# Altium integrated library BS_Altium_Lib.IntLib: 1016 symbols (part 1 of 8) (continued)
## ERJ-3EKF3902V (continued)
RES SMD 39K OHM 1% 1/10W 0603; Manufacturer: Panasonic Electronic Components; Manufacturer Part Number: ERJ-3EKF3902V; Power (Watts): 0.1W, 1/10W; Temperature Coefficient: ±100ppm/°C; Power Rating: 100 mW; Voltage Rating: 75 V; Brand: Panasonic; Qualification: AEC-Q200; Supplier 1: Digi-Key; Supplier Part Number 1: P39.0KHCT-ND; RoHS: RoHS Compliant; Category: Resistors; Stock 1: 73592; Pricing 1: 1=0.1, 50=0.0114, 100=0.0084, 250=0.00644, 500=0.00514, 1000=0.00379 (USD); Packaging: Cut Tape (CT); Part Status: Active; Tolerance: ±1%; Composition: Thick Film; Features: Automotive AEC-Q200; Operating Temperature: -55°C ~ 155°C; Package: 0603 (1608 Metric); Supplier Device Package: 0603; Size / Dimension: 0.063" L x 0.031" W (1.60mm x 0.80mm); Height - Seated (Max): 0.022" (0.55mm); Number of Terminations: 2; Failure Rate: -; ComponentLink1URL: http://industrial.panasonic.com/www-cgi/jvcr13pz.cgi?E+PZ+3+AOA0002+ERJ3EKF3902V+7+WW; ComponentLink1Description: http://industrial.panasonic.com/www-cgi/jvcr13pz.cgi?E+PZ+3+AOA0002+ERJ3EKF3902V+7+WW; Supplier 2: Mouser; Supplier Part Number 2: 667-ERJ-3EKF3902V; Stock 2: 117887; Pricing 2: 1=0.150, 10=0.014, 100=0.006, 1000=0.004, 5000=0.002 (USD); Height: 0.45 mm; Length: 1.6 mm; Operating Temperature Range: - 55 C to + 155 C; Product: Thick Film Resistors SMD; Resistance: 39k; Series: ERJ; Termination Style: SMD/SMT; Type: Precision Thick Film Resistors SMD; Width: 0.8 mm; Case Code - in: 0603; Case Code - mm: 1608; Standard Pack Qty: 5000; RoHS - Mouser: E; Minimum Order Quantity: 1; Reeling: True; ComponentLink2URL: http://www.mouser.com/ds/2/315/AOA0000C86-911473.pdf; ComponentLink2Description: http://www.mouser.com/ds/2/315/AOA0000C86-911473.pdf
footprint R 0603 (Chip Resistor, 2-Leads, Body 1.6x0.8mm, IPC Medium Density)
pins: 1, 2

## ERJ-3EKF6811V
designator R?, comment 6.81k
RES SMD 6.81K OHM 1% 1/10W 0603; Manufacturer: Panasonic Electronic Components; Manufacturer Part Number: ERJ-3EKF6811V; Power (Watts): 0.1W, 1/10W; Temperature Coefficient: ±100ppm/°C; Power Rating: 100 mW; Voltage Rating: 75 V; Brand: Panasonic; Qualification: AEC-Q200; Supplier 1: Digi-Key; Supplier Part Number 1: P6.81KHCT-ND; RoHS: RoHS Compliant; Category: Resistors; Stock 1: 89608; Pricing 1: 1=0.1, 50=0.0114, 100=0.0084, 250=0.00644, 500=0.00514, 1000=0.00379 (USD); Packaging: Cut Tape (CT); Part Status: Active; Tolerance: ±1%; Composition: Thick Film; Features: Automotive AEC-Q200; Operating Temperature: -55°C ~ 155°C; Package: 0603 (1608 Metric); Supplier Device Package: 0603; Size / Dimension: 0.063" L x 0.031" W (1.60mm x 0.80mm); Height - Seated (Max): 0.022" (0.55mm); Number of Terminations: 2; Failure Rate: -; ComponentLink1URL: http://industrial.panasonic.com/www-cgi/jvcr13pz.cgi?E+PZ+3+AOA0002+ERJ3EKF6811V+7+WW; ComponentLink1Description: http://industrial.panasonic.com/www-cgi/jvcr13pz.cgi?E+PZ+3+AOA0002+ERJ3EKF6811V+7+WW; Supplier 2: Mouser; Supplier Part Number 2: 667-ERJ-3EKF6811V; Stock 2: 90189; Pricing 2: 1=0.150, 10=0.014, 100=0.006, 1000=0.004, 5000=0.002 (USD); Height: 0.45 mm; Length: 1.6 mm; Operating Temperature Range: - 55 C to + 155 C; Product: Thick Film Resistors SMD; Resistance: 6.81k; Series: ERJ; Termination Style: SMD/SMT; Type: Precision Thick Film Resistors SMD; Width: 0.8 mm; Case Code - in: 0603; Case Code - mm: 1608; Standard Pack Qty: 5000; RoHS - Mouser: E; Minimum Order Quantity: 1; Reeling: True; ComponentLink2URL: http://www.mouser.com/ds/2/315/AOA0000C86-911473.pdf; ComponentLink2Description: http://www.mouser.com/ds/2/315/AOA0000C86-911473.pdf
footprint R 0603 (Chip Resistor, 2-Leads, Body 1.6x0.8mm, IPC Medium Density)
pins: 1, 2

## ERJ-6ENF2700V
designator R?, comment 270
RES SMD 270 OHM 1% 1/8W 0805; Manufacturer: Panasonic Electronic Components; Manufacturer Part Number: ERJ-6ENF2700V; Power (Watts): 0.125W, 1/8W; Temperature Coefficient: ±100ppm/°C; Supplier 1: Digi-Key; Supplier Part Number 1: P270CCT-ND; RoHS: RoHS Compliant; Category: Resistors; Stock 1: 69627; Pricing 1: 1=0.1, 50=0.022, 100=0.0162, 250=0.01236, 500=0.0099, 1000=0.00729 (USD); Packaging: Cut Tape (CT); Part Status: Active; Tolerance: ±1%; Composition: Thick Film; Features: Automotive AEC-Q200; Operating Temperature: -55°C ~ 155°C; Package: 0805 (2012 Metric); Supplier Device Package: 0805; Size / Dimension: 0.079" L x 0.049" W (2.00mm x 1.25mm); Height - Seated (Max): 0.028" (0.70mm); Number of Terminations: 2; Failure Rate: -; ComponentLink1URL: http://industrial.panasonic.com/www-cgi/jvcr13pz.cgi?E+PZ+3+AOA0002+ERJ6ENF2700V+7+WW; ComponentLink1Description: http://industrial.panasonic.com/www-cgi/jvcr13pz.cgi?E+PZ+3+AOA0002+ERJ6ENF2700V+7+WW; Supplier 2: Mouser; Supplier Part Number 2: 667-ERJ-6ENF2700V; Resistance: 270
footprint R 0805 (Chip Resistor, 2-Leads, Body 2.0x1.3mm, IPC Medium Density)
pins: 1, 2

## ERJ-6ENF3300V
designator R?, comment 330
RES SMD 330 OHM 1% 1/8W 0805; Manufacturer: Panasonic Electronic Components; Manufacturer Part Number: ERJ-6ENF3300V; Power (Watts): 0.125W, 1/8W; Temperature Coefficient: ±100ppm/°C; Supplier 1: Digi-Key; Supplier Part Number 1: P330CCT-ND; RoHS: RoHS Compliant; Category: Resistors; Stock 1: 306218; Pricing 1: 1=0.1, 50=0.022, 100=0.0162, 250=0.01236, 500=0.0099, 1000=0.00729 (USD); Packaging: Cut Tape (CT); Part Status: Active; Tolerance: ±1%; Composition: Thick Film; Features: Automotive AEC-Q200; Operating Temperature: -55°C ~ 155°C; Package: 0805 (2012 Metric); Supplier Device Package: 0805; Size / Dimension: 0.079" L x 0.049" W (2.00mm x 1.25mm); Height - Seated (Max): 0.028" (0.70mm); Number of Terminations: 2; Failure Rate: -; ComponentLink1URL: http://industrial.panasonic.com/www-cgi/jvcr13pz.cgi?E+PZ+3+AOA0002+ERJ6ENF3300V+7+WW; ComponentLink1Description: http://industrial.panasonic.com/www-cgi/jvcr13pz.cgi?E+PZ+3+AOA0002+ERJ6ENF3300V+7+WW; Supplier 2: Mouser; Supplier Part Number 2: 667-ERJ-6ENF3300V; Resistance: 330
footprint R 0805 (Chip Resistor, 2-Leads, Body 2.0x1.3mm, IPC Medium Density)
pins: 1, 2

## ERJ-6ENF3600V
designator R?, comment 360
RES SMD 360 OHM 1% 1/8W 0805; Manufacturer: Panasonic Electronic Components; Manufacturer Part Number: ERJ-6ENF3600V; Power (Watts): 0.125W, 1/8W; Temperature Coefficient: ±100ppm/°C; Supplier 1: Digi-Key; Supplier Part Number 1: P360CCT-ND; RoHS: RoHS Compliant; Category: Resistors; Stock 1: 60828; Pricing 1: 1=0.1, 50=0.022, 100=0.0162, 250=0.01236, 500=0.0099, 1000=0.00729 (USD); Packaging: Cut Tape (CT); Part Status: Active; Tolerance: ±1%; Composition: Thick Film; Features: Automotive AEC-Q200; Operating Temperature: -55°C ~ 155°C; Package: 0805 (2012 Metric); Supplier Device Package: 0805; Size / Dimension: 0.079" L x 0.049" W (2.00mm x 1.25mm); Height - Seated (Max): 0.028" (0.70mm); Number of Terminations: 2; Failure Rate: -; ComponentLink1URL: http://industrial.panasonic.com/www-cgi/jvcr13pz.cgi?E+PZ+3+AOA0002+ERJ6ENF3600V+7+WW; ComponentLink1Description: http://industrial.panasonic.com/www-cgi/jvcr13pz.cgi?E+PZ+3+AOA0002+ERJ6ENF3600V+7+WW; Supplier 2: Mouser; Supplier Part Number 2: 667-ERJ-6ENF3600V; Resistance: 360
footprint R 0805 (Chip Resistor, 2-Leads, Body 2.0x1.3mm, IPC Medium Density)
pins: 1, 2

## ERJ-6GEYJ2R2V
designator R?, comment 2.2
RES SMD 2.2 OHM 5% 1/8W 0805; Manufacturer: Panasonic Electronic Components; Manufacturer Part Number: ERJ-6GEYJ2R2V; Power (Watts): 0.125W, 1/8W; Temperature Coefficient: -100/ +600ppm/°C; Power Rating: 125 mW (1/8 W); Voltage Rating: 150 V; Brand: Panasonic; Qualification: AEC-Q200; Supplier 1: Digi-Key; Supplier Part Number 1: P2.2ACT-ND; RoHS: RoHS Compliant; Category: Resistors; Stock 1: 79744; Pricing 1: 1=0.1, 50=0.015, 100=0.011, 250=0.0084, 500=0.00674, 1000=0.00496 (USD); Packaging: Cut Tape (CT); Part Status: Active; Tolerance: ±5%; Composition: Thick Film; Features: Automotive AEC-Q200; Operating Temperature: -55°C ~ 155°C; Package: 0805 (2012 Metric); Supplier Device Package: 0805; Size / Dimension: 0.079" L x 0.049" W (2.00mm x 1.25mm); Height - Seated (Max): 0.028" (0.70mm); Number of Terminations: 2; Failure Rate: -; ComponentLink1URL: http://industrial.panasonic.com/www-cgi/jvcr13pz.cgi?E+PZ+3+AOA0001+ERJ6GEYJ2R2V+7+WW; ComponentLink1Description: http://industrial.panasonic.com/www-cgi/jvcr13pz.cgi?E+PZ+3+AOA0001+ERJ6GEYJ2R2V+7+WW; Supplier 2: Mouser; Supplier Part Number 2: 667-ERJ-6GEYJ2R2V; Stock 2: 22650; Pricing 2: 1=0.100, 10=0.015, 100=0.006, 1000=0.004, 5000=0.003, 10000=0.002 (USD); Height: 0.6 mm; Length: 2 mm; Operating Temperature Range: - 55 C to + 155 C; Product: Thick Film Resistors SMD; Resistance: 2.2; Series: ERJ; Termination Style: SMD/SMT; Type: Thick Film Resistors SMD; Width: 1.25 mm; Case Code - in: 0805; Case Code - mm: 2012; Standard Pack Qty: 5000; RoHS - Mouser: E; Minimum Order Quantity: 1; Reeling: True; ComponentLink2URL: http://www.mouser.com/ds/2/315/AOA0000C84-947596.pdf; ComponentLink2Description: http://www.mouser.com/ds/2/315/AOA0000C84-947596.pdf
footprint R 0805 (Chip Resistor, 2-Leads, Body 2.0x1.3mm, IPC Medium Density)
pins: 1, 2

## ERJ-6GEYJ4R7V
designator R?, comment 4.7
RES SMD 4.7 OHM 5% 1/8W 0805; Manufacturer: Panasonic Electronic Components; Manufacturer Part Number: ERJ-6GEYJ4R7V; Power (Watts): 0.125W, 1/8W; Temperature Coefficient: -100/ +600ppm/°C; Power Rating: 125 mW (1/8 W); Voltage Rating: 150 V; Brand: Panasonic; Qualification: AEC-Q200; Supplier 1: Digi-Key; Supplier Part Number 1: P4.7ACT-ND; RoHS: RoHS Compliant; Category: Resistors; Stock 1: 388455; Pricing 1: 1=0.1, 50=0.015, 100=0.011, 250=0.0084, 500=0.00674, 1000=0.00496 (USD); Packaging: Cut Tape (CT); Part Status: Active; Tolerance: ±5%; Composition: Thick Film; Features: Automotive AEC-Q200; Operating Temperature: -55°C ~ 155°C; Package: 0805 (2012 Metric); Supplier Device Package: 0805; Size / Dimension: 0.079" L x 0.049" W (2.00mm x 1.25mm); Height - Seated (Max): 0.028" (0.70mm); Number of Terminations: 2; Failure Rate: -; ComponentLink1URL: http://industrial.panasonic.com/www-cgi/jvcr13pz.cgi?E+PZ+3+AOA0001+ERJ6GEYJ4R7V+7+WW; ComponentLink1Description: http://industrial.panasonic.com/www-cgi/jvcr13pz.cgi?E+PZ+3+AOA0001+ERJ6GEYJ4R7V+7+WW; Supplier 2: Mouser; Supplier Part Number 2: 667-ERJ-6GEYJ4R7V; Stock 2: 152827; Pricing 2: 1=0.100, 10=0.015, 100=0.006, 1000=0.004, 5000=0.003, 10000=0.002 (USD); Height: 0.6 mm; Length: 2 mm; Operating Temperature Range: - 55 C to + 155 C; Product: Thick Film Resistors SMD; Resistance: 4.7; Termination Style: SMD/SMT; Type: Thick Film Resistors SMD; Width: 1.25 mm; Case Code - in: 0805; Case Code - mm: 2012; Standard Pack Qty: 5000; RoHS - Mouser: E; Minimum Order Quantity: 1; Reeling: True; ComponentLink2URL: http://www.mouser.com/ds/2/315/AOA0000C84-947596.pdf; ComponentLink2Description: http://www.mouser.com/ds/2/315/AOA0000C84-947596.pdf
footprint R 0805 (Chip Resistor, 2-Leads, Body 2.0x1.3mm, IPC Medium Density)
pins: 1, 2

## ERJ-6GEYJ682V
designator R?, comment 6.8k
RES SMD 6.8K OHM 5% 1/8W 0805; Manufacturer: Panasonic Electronic Components; Manufacturer Part Number: ERJ-6GEYJ682V; Power (Watts): 0.125W, 1/8W; Temperature Coefficient: ±200ppm/°C; Power Rating: 125 mW (1/8 W); Voltage Rating: 150 V; Brand: Panasonic; Qualification: AEC-Q200; Supplier 1: Digi-Key; Supplier Part Number 1: P6.8KACT-ND; RoHS: RoHS Compliant; Category: Resistors; Stock 1: 86620; Pricing 1: 1=0.1, 50=0.015, 100=0.011, 250=0.0084, 500=0.00674, 1000=0.00496 (USD); Packaging: Cut Tape (CT); Part Status: Active; Tolerance: ±5%; Composition: Thick Film; Features: Automotive AEC-Q200; Operating Temperature: -55°C ~ 155°C; Package: 0805 (2012 Metric); Supplier Device Package: 0805; Size / Dimension: 0.079" L x 0.049" W (2.00mm x 1.25mm); Height - Seated (Max): 0.028" (0.70mm); Number of Terminations: 2; Failure Rate: -; ComponentLink1URL: http://industrial.panasonic.com/www-cgi/jvcr13pz.cgi?E+PZ+3+AOA0001+ERJ6GEYJ682V+7+WW; ComponentLink1Description: http://industrial.panasonic.com/www-cgi/jvcr13pz.cgi?E+PZ+3+AOA0001+ERJ6GEYJ682V+7+WW; Supplier 2: Mouser; Supplier Part Number 2: 667-ERJ-6GEYJ682V; Stock 2: 75068; Pricing 2: 1=0.100, 10=0.015, 100=0.006, 1000=0.004, 5000=0.003, 10000=0.002 (USD); Height: 0.6 mm; Length: 2 mm; Operating Temperature Range: - 55 C to + 155 C; Product: Thick Film Resistors SMD; Resistance: 6.8k; Series: ERJ; Termination Style: SMD/SMT; Type: Thick Film Resistors SMD; Width: 1.25 mm; Case Code - in: 0805; Case Code - mm: 2012; Standard Pack Qty: 5000; RoHS - Mouser: E; Minimum Order Quantity: 1; Reeling: True; ComponentLink2URL: http://www.mouser.com/ds/2/315/AOA0000C84-947596.pdf; ComponentLink2Description: http://www.mouser.com/ds/2/315/AOA0000C84-947596.pdf
footprint R 0805 (Chip Resistor, 2-Leads, Body 2.0x1.3mm, IPC Medium Density)
pins: 1, 2

## ERJ-6RQF2R2V
designator R?, comment 2.2
RES SMD 2.2 OHM 1% 1/8W 0805; Manufacturer: Panasonic Electronic Components; Manufacturer Part Number: ERJ-6RQF2R2V; Power (Watts): 0.125W, 1/8W; Temperature Coefficient: ±200ppm/°C; Power Rating: 125 mW (1/8 W); Brand: Panasonic; Qualification: AEC-Q200; Supplier 1: Digi-Key; RoHS: RoHS Compliant; Category: Resistors; Stock 1: 46645; Pricing 1: 1=0.57, 50=0.2266, 100=0.1748, 250=0.13596, 500=0.09584, 1000=0.06993 (USD); Packaging: Cut Tape (CT); Part Status: Active; Tolerance: ±1%; Composition: Thick Film; Features: Automotive AEC-Q200, Current Sense; Operating Temperature: -55°C ~ 125°C; Package: 0805 (2012 Metric); Supplier Device Package: 0805; Size / Dimension: 0.079" L x 0.049" W (2.00mm x 1.25mm); Height - Seated (Max): 0.028" (0.70mm); Number of Terminations: 2; Failure Rate: -; ComponentLink1URL: https://industrial.panasonic.com/cdbs/www-data/pdf/RDA0000/AOA0000C239.pdf; ComponentLink1Description: https://industrial.panasonic.com/cdbs/www-data/pdf/RDA0000/AOA0000C239.pdf; Supplier 2: Mouser; Stock 2: 25180; Pricing 2: 1=0.570, 10=0.226, 100=0.135, 500=0.095, 1000=0.069, 5000=0.038, 10000=0.036, 25000=0.034, 50000=0.033 (USD); Height: 0.6 mm; Length: 2 mm; Operating Temperature Range: - 55 C to + 125 C; Product: Thick Film Resistors SMD; Resistance: 2.2; Series: ERJ; Technology: Thick Film; Termination Style: SMD/SMT; Type: Thick Film Resistors, Low Resistance Type; Width: 1.2 mm; Case Code - in: 0805; Case Code - mm: 2012; Standard Pack Qty: 5000; Termination: -; RoHS - Mouser: E; Minimum Order Quantity: 1; Reeling: True; ComponentLink2URL: http://www.mouser.com/ds/2/315/AOA0000C239-947529.pdf; ComponentLink2Description: http://www.mouser.com/ds/2/315/AOA0000C239-947529.pdf; Supplier Part Number 1: P2.2DCT-ND; Supplier Part Number 2: 667-ERJ-6RQF2R2V
footprint R 0805 (Chip Resistor, 2-Leads, Body 2.0x1.3mm, IPC Medium Density)
pins: 1, 2

## ERJ-8ENF1003V
designator R?, comment 100k
RES SMD 100K OHM 1% 1/4W 1206; Manufacturer: Panasonic Electronic Components; Manufacturer Part Number: ERJ-8ENF1003V; Power (Watts): 0.25W, 1/4W; Temperature Coefficient: ±100ppm/°C; Power Rating: 250 mW (1/4 W); Voltage Rating: 200 V; Brand: Panasonic; Qualification: AEC-Q200; Supplier 1: Digi-Key; Supplier Part Number 1: P100KFCT-ND; RoHS: RoHS Compliant; Category: Resistors; Stock 1: 635930; Pricing 1: 1=0.1, 50=0.0282, 100=0.0208, 250=0.01584, 500=0.01268, 1000=0.00933 (USD); Packaging: Cut Tape (CT); Part Status: Active; Tolerance: ±1%; Composition: Thick Film; Features: Automotive AEC-Q200; Operating Temperature: -55°C ~ 155°C; Package: 1206 (3216 Metric); Supplier Device Package: 1206; Size / Dimension: 0.126" L x 0.063" W (3.20mm x 1.60mm); Height - Seated (Max): 0.028" (0.70mm); Number of Terminations: 2; Failure Rate: -; ComponentLink1URL: http://industrial.panasonic.com/www-cgi/jvcr13pz.cgi?E+PZ+3+AOA0002+ERJ8ENF1003V+7+WW; ComponentLink1Description: http://industrial.panasonic.com/www-cgi/jvcr13pz.cgi?E+PZ+3+AOA0002+ERJ8ENF1003V+7+WW; Supplier 2: Mouser; Supplier Part Number 2: 667-ERJ-8ENF1003V; Stock 2: 124349; Pricing 2: 1=0.100, 10=0.028, 100=0.012, 1000=0.009, 5000=0.006, 10000=0.005, 25000=0.004 (USD); Height: 0.6 mm; Length: 3.2 mm; Operating Temperature Range: - 55 C to + 155 C; Product: Thick Film Resistors SMD; Resistance: 100k; Termination Style: SMD/SMT; Type: Precision Thick Film Resistors SMD; Width: 1.6 mm; Case Code - in: 1206; Case Code - mm: 3216; Standard Pack Qty: 5000; RoHS - Mouser: E; Minimum Order Quantity: 1; Reeling: True; ComponentLink2URL: http://www.mouser.com/ds/2/315/AOA0000C86-911473.pdf; ComponentLink2Description: http://www.mouser.com/ds/2/315/AOA0000C86-911473.pdf
footprint R 1206 (Chip Resistor, 2-Leads, Body 3.1x1.6mm, IPC Medium Density)
pins: 1, 2

## ERJ-8ENF1501V
designator R?, comment 1.5k
RES SMD 1.5K OHM 1% 1/4W 1206; Manufacturer: Panasonic Electronic Components; Manufacturer Part Number: ERJ-8ENF1501V; Power (Watts): 0.25W, 1/4W; Temperature Coefficient: ±100ppm/°C; Power Rating: 250 mW (1/4 W); Voltage Rating: 200 V; Brand: Panasonic; Qualification: AEC-Q200; Supplier 1: Digi-Key; Supplier Part Number 1: P1.50KFCT-ND; RoHS: RoHS Compliant; Category: Resistors; Stock 1: 227687; Pricing 1: 1=0.1, 50=0.0282, 100=0.0208, 250=0.01584, 500=0.01268, 1000=0.00933 (USD); Packaging: Cut Tape (CT); Part Status: Active; Tolerance: ±1%; Composition: Thick Film; Features: Automotive AEC-Q200; Operating Temperature: -55°C ~ 155°C; Package: 1206 (3216 Metric); Supplier Device Package: 1206; Size / Dimension: 0.126" L x 0.063" W (3.20mm x 1.60mm); Height - Seated (Max): 0.028" (0.70mm); Number of Terminations: 2; Failure Rate: -; ComponentLink1URL: http://industrial.panasonic.com/www-cgi/jvcr13pz.cgi?E+PZ+3+AOA0002+ERJ8ENF1501V+7+WW; ComponentLink1Description: http://industrial.panasonic.com/www-cgi/jvcr13pz.cgi?E+PZ+3+AOA0002+ERJ8ENF1501V+7+WW; Supplier 2: Mouser; Supplier Part Number 2: 667-ERJ-8ENF1501V; Stock 2: 57781; Pricing 2: 1=0.100, 10=0.028, 100=0.012, 1000=0.009, 5000=0.006, 10000=0.005, 25000=0.004 (USD); Height: 0.6 mm; Length: 3.2 mm; Operating Temperature Range: - 55 C to + 155 C; Product: Thick Film Resistors SMD; Resistance: 1.5k; Series: ERJ; Termination Style: SMD/SMT; Type: Precision Thick Film Resistors SMD; Width: 1.6 mm; Case Code - in: 1206; Case Code - mm: 3216; Standard Pack Qty: 5000; RoHS - Mouser: E; Minimum Order Quantity: 1; Reeling: True; ComponentLink2URL: http://www.mouser.com/ds/2/315/AOA0000C86-911473.pdf; ComponentLink2Description: http://www.mouser.com/ds/2/315/AOA0000C86-911473.pdf
footprint R 1206 (Chip Resistor, 2-Leads, Body 3.1x1.6mm, IPC Medium Density)
pins: 1, 2

## ERJ-PA3J472V
designator R?, comment 4.7K  Package: 0603
RES SMD 4.7K OHM 5% 1/4W 0603; Manufacturer: Panasonic Electronic Components; Manufacturer Part Number: ERJ-PA3J472V; Power (Watts): 0.25W, 1/4W; Temperature Coefficient: ±200ppm/°C; Supplier 1: Digi-Key; Supplier Part Number 1: P4.7KBZCT-ND; RoHS: RoHS Compliant; Category: Resistors; Stock 1: 4628; Pricing 1: 1=0.11, 10=0.1, 100=0.0384, 1000=0.0169, 2500=0.0146 (USD); Packaging: Cut Tape (CT); Part Status: Active; Tolerance: ±5%; Composition: Thick Film; Features: Automotive AEC-Q200, Pulse Withstanding; Operating Temperature: -55°C ~ 155°C; Supplier Device Package: 0603; Size / Dimension: 0.063" L x 0.031" W (1.60mm x 0.80mm); Height - Seated (Max): 0.022" (0.55mm); Failure Rate: -; ComponentLink1URL: https://industrial.panasonic.com/cdbs/www-data/pdf/RDO0000/AOA0000C331.pdf; ComponentLink1Description: https://industrial.panasonic.com/cdbs/www-data/pdf/RDO0000/AOA0000C331.pdf; Resistance: 4.7K
footprint R 0603 (Chip Resistor, 2-Leads, Body 1.6x0.8mm, IPC Medium Density)
pins: 1, 2

## ERJ-PA3J473V
designator R?, comment 47K  Package: 0603
RES SMD 47K OHM 5% 1/4W 0603; Manufacturer: Panasonic Electronic Components; Manufacturer Part Number: ERJ-PA3J473V; Power (Watts): 0.25W, 1/4W; Temperature Coefficient: ±200ppm/°C; Supplier 1: Digi-Key; Supplier Part Number 1: P47KBZCT-ND; RoHS: RoHS Compliant; Category: Resistors; Stock 1: 252; Pricing 1: 1=0.11, 10=0.1, 100=0.0384, 1000=0.0169, 2500=0.0146 (USD); Packaging: Cut Tape (CT); Part Status: Active; Tolerance: ±5%; Composition: Thick Film; Features: Automotive AEC-Q200, Pulse Withstanding; Operating Temperature: -55°C ~ 155°C; Supplier Device Package: 0603; Size / Dimension: 0.063" L x 0.031" W (1.60mm x 0.80mm); Height - Seated (Max): 0.022" (0.55mm); Failure Rate: -; ComponentLink1URL: https://industrial.panasonic.com/cdbs/www-data/pdf/RDO0000/AOA0000C331.pdf; ComponentLink1Description: https://industrial.panasonic.com/cdbs/www-data/pdf/RDO0000/AOA0000C331.pdf; Resistance: 47K
footprint R 0603 (Chip Resistor, 2-Leads, Body 1.6x0.8mm, IPC Medium Density)
pins: 1, 2

## RC0603FR-076K81L
designator R?, comment 6.81k
RES SMD 6.81K OHM 1% 1/10W 0603; Manufacturer: Yageo; Manufacturer Part Number: RC0603FR-076K81L; Power (Watts): 0.1W, 1/10W; Temperature Coefficient: ±100ppm/°C; Power Rating: 100 mW; Voltage Rating: 75 V; Supplier 1: Digi-Key; RoHS: RoHS Compliant; Category: Resistors; Stock 1: 193997; Pricing 1: 1=0.1, 10=0.014, 25=0.01, 100=0.0057, 250=0.00436, 500=0.00348, 1000=0.00257, 2500=0.00223 (USD); Packaging: Cut Tape (CT); Part Status: Active; Tolerance: ±1%; Composition: Thick Film; Features: Moisture Resistant; Operating Temperature: -55°C ~ 155°C; Package: 0603 (1608 Metric); Supplier Device Package: 0603; Size / Dimension: 0.063" L x 0.031" W (1.60mm x 0.80mm); Height - Seated (Max): 0.022" (0.55mm); Number of Terminations: 2; Failure Rate: -; ComponentLink1URL: http://www.yageo.com/NewPortal/yageodocoutput?fileName=/pdf/R-Chip/PYu-RC_Group_51_RoHS_L_4.pdf; ComponentLink1Description: http://www.yageo.com/NewPortal/yageodocoutput?fileName=/pdf/R-Chip/PYu-RC_Group_51_RoHS_L_4.pdf; Supplier 2: Mouser; Stock 2: 33413; Pricing 2: 1=0.100, 10=0.010, 100=0.003, 1000=0.002, 5000=0.002, 10000=0.001 (USD); Height: 0.45 mm; Length: 1.6 mm; Operating Temperature Range: - 55 C to + 155 C; Product: Thick Film Resistors General Purpose; Resistance: 6.81k; Series: RC; Termination Style: SMD/SMT; Type: General Purpose Chip Resistor Surface Mount; Width: 0.8 mm; Brand: Yageo; Case Code - in: 0603; Case Code - mm: 1608; Standard Pack Qty: 5000; RoHS - Mouser: Y; Minimum Order Quantity: 1; Reeling: True; ComponentLink2URL: http://www.mouser.com/ds/2/447/RC0603-272842.pdf; ComponentLink2Description: http://www.mouser.com/ds/2/447/RC0603-272842.pdf; Supplier Part Number 1: 311-6.81KHRCT-ND; Supplier Part Number 2: 603-RC0603FR-076K81L
footprint R 0603 (Chip Resistor, 2-Leads, Body 1.6x0.8mm, IPC Medium Density)
pins: 1, 2

## RC0603JR-0727KL
designator R?, comment 27k
RES SMD 27K OHM 5% 1/10W 0603; Manufacturer: Yageo; Manufacturer Part Number: RC0603JR-0727KL; Power (Watts): 0.1W, 1/10W; Temperature Coefficient: ±100ppm/°C; Power Rating: 100 mW; Voltage Rating: 75 V; Supplier 1: Digi-Key; RoHS: RoHS Compliant; Category: Resistors; Stock 1: 224441; Pricing 1: 1=0.1, 10=0.011, 25=0.008, 100=0.0044, 250=0.00336, 500=0.0027, 1000=0.00198, 2500=0.00172 (USD); Packaging: Cut Tape (CT); Part Status: Active; Tolerance: ±5%; Composition: Thick Film; Features: Moisture Resistant; Operating Temperature: -55°C ~ 155°C; Package: 0603 (1608 Metric); Supplier Device Package: 0603; Size / Dimension: 0.063" L x 0.031" W (1.60mm x 0.80mm); Height - Seated (Max): 0.022" (0.55mm); Number of Terminations: 2; Failure Rate: -; ComponentLink1URL: http://www.yageo.com/NewPortal/yageodocoutput?fileName=/pdf/R-Chip/PYu-RC_Group_51_RoHS_L_4.pdf; ComponentLink1Description: http://www.yageo.com/NewPortal/yageodocoutput?fileName=/pdf/R-Chip/PYu-RC_Group_51_RoHS_L_4.pdf; Supplier 2: Mouser; Stock 2: 93723; Pricing 2: 1=0.100, 10=0.008, 100=0.003, 1000=0.002, 5000=0.002, 50000=0.001 (USD); Height: 0.45 mm; Length: 1.6 mm; Operating Temperature Range: - 55 C to + 155 C; Product: Thick Film Resistors General Purpose; Resistance: 27k; Series: RC; Termination Style: SMD/SMT; Type: General Purpose Chip Resistor Surface Mount; Width: 0.8 mm; Brand: Yageo; Case Code - in: 0603; Case Code - mm: 1608; Standard Pack Qty: 5000; RoHS - Mouser: Y; Minimum Order Quantity: 1; Reeling: True; ComponentLink2URL: http://www.mouser.com/ds/2/447/RC0603-272842.pdf; ComponentLink2Description: http://www.mouser.com/ds/2/447/RC0603-272842.pdf; Supplier Part Number 1: 311-27KGRCT-ND; Supplier Part Number 2: 603-RC0603JR-0727KL
footprint R 0603 (Chip Resistor, 2-Leads, Body 1.6x0.8mm, IPC Medium Density)
pins: 1, 2

## RC1206FR-07100KL
designator R?, comment 100k
RES SMD 100K OHM 1% 1/4W 1206; Manufacturer: Yageo; Manufacturer Part Number: RC1206FR-07100KL; Power (Watts): 0.25W, 1/4W; Temperature Coefficient: ±100ppm/°C; Power Rating: 250 mW (1/4 W); Voltage Rating: 200 V; Supplier 1: Digi-Key; RoHS: RoHS Compliant; Category: Resistors; Stock 1: 2137961; Pricing 1: 1=0.1, 10=0.032, 25=0.0232, 100=0.013, 250=0.00992, 500=0.00792, 1000=0.00583, 2500=0.00506 (USD); Packaging: Cut Tape (CT); Part Status: Active; Tolerance: ±1%; Composition: Thick Film; Features: Moisture Resistant; Operating Temperature: -55°C ~ 155°C; Package: 1206 (3216 Metric); Supplier Device Package: 1206; Size / Dimension: 0.122" L x 0.063" W (3.10mm x 1.60mm); Height - Seated (Max): 0.026" (0.65mm); Number of Terminations: 2; Failure Rate: -; ComponentLink1URL: http://www.yageo.com/NewPortal/yageodocoutput?fileName=/pdf/R-Chip/PYu-RC_Group_51_RoHS_L_4.pdf; ComponentLink1Description: http://www.yageo.com/NewPortal/yageodocoutput?fileName=/pdf/R-Chip/PYu-RC_Group_51_RoHS_L_4.pdf; Supplier 2: Mouser; Stock 2: 249054; Pricing 2: 1=0.100, 10=0.024, 100=0.009, 1000=0.006, 5000=0.004, 25000=0.003 (USD); Diameter: -; Height: 0.55 mm; Length: 3.2 mm; Operating Temperature Range: - 55 C to + 155 C; Product: Thick Film Resistors General Purpose; Resistance: 100k; Series: RC1206; Termination Style: SMD/SMT; Type: General Purpose Chip Resistors; Width: 1.6 mm; Brand: Yageo; Case Code - in: 1206; Case Code - mm: 3216; Standard Pack Qty: 5000; RoHS - Mouser: E; Minimum Order Quantity: 1; Reeling: True; ComponentLink2URL: http://www.mouser.com/ds/2/447/PYu-RC1206_51_RoHS_L-4-349080.pdf; ComponentLink2Description: http://www.mouser.com/ds/2/447/PYu-RC1206_51_RoHS_L-4-349080.pdf; Supplier Part Number 1: 311-100KFRCT-ND; Supplier Part Number 2: 603-RC1206FR-07100KL
footprint R 1206 (Chip Resistor, 2-Leads, Body 3.1x1.6mm, IPC Medium Density)
pins: 1, 2


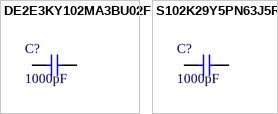
[diagram p13: symbols DE2E3KY102MA3BU02F to S102K29Y5PN63J5R]

## DE2E3KY102MA3BU02F
designator C?, comment 1000pF
CAP CER 1000PF 300VAC RADIAL; Manufacturer: Murata Electronics North America; Manufacturer Part Number: DE2E3KY102MA3BU02F; Tolerance: ±20%; Temperature Coefficient: E; Ratings: X1, Y2; Type: Safety Standard Certified Ceramic Capacitors; Voltage Rating: 300 V; Brand: Murata Electronics; Capacitance - nF: 1 nF; Capacitance - uF: 0.001 uF; Lead Diameter: 0.6 mm; Supplier 1: Digi-Key; RoHS: RoHS Compliant; Category: Capacitors; Stock 1: 1429; Pricing 1: 1=0.3, 10=0.21, 50=0.1466, 100=0.1257, 250=0.10476, 500=0.09428, 1000=0.07961, 5000=0.07123, 10000=0.06704 (USD); Packaging: Bulk; Part Status: Active; Capacitance: 1000pF; Voltage - Rated: 300VAC; Operating Temperature: -25°C ~ 85°C; Features: High Voltage; Applications: Safety; Failure Rate: *; Mounting Type: Through Hole; Package / Case: Radial, Disc; Size / Dimension: 0.276" Dia (7.00mm); Height - Seated (Max): 0.394" (10.00mm); Thickness (Max): -; Lead Spacing: 0.295" (7.50mm); Lead Style: Formed Leads; ComponentLink1URL: http://www.murata.com/~/media/webrenewal/support/library/catalog/products/capacitor/mlcc/c85e.ashx; ComponentLink1Description: http://www.murata.com/~/media/webrenewal/support/library/catalog/products/capacitor/mlcc/c85e.ashx; Supplier 2: Mouser; Stock 2: 1184; Pricing 2: 1=0.290, 10=0.172, 100=0.105, 500=0.094, 1000=0.080, 2500=0.071, 10000=0.067, 25000=0.063, 50000=0.056 (USD); Application: Safety; Diameter: 7 mm; Operating Temperature Range: - 25 C to + 85 C; Product: High Voltage Ceramic Disc Capacitors; Series: DE2; Termination Style: Radial; Thickness: 5 mm; Voltage Rating AC: 300 V; Class: X1, Y2; Dielectric: E; Maximum Operating Temperature: + 85 C; Minimum Operating Temperature: - 20 C; Standard Pack Qty: 250; Temperature Coefficient / Code: E; RoHS - Mouser: Y; Minimum Order Quantity: 1; Reeling: False; ComponentLink2URL: http://www.mouser.com/ds/2/281/L0015E-125407.pdf; ComponentLink2Description: http://www.mouser.com/ds/2/281/L0015E-125407.pdf; Supplier Part Number 1: 490-9458-ND; Supplier Part Number 2: 81-DE2E3KY102MA3BU2F
footprint DISC/D7.0/F7.5
pins: 1, 2

## S102K29Y5PN63J5R
designator C?, comment 1000pF
CAP CER 1000PF 1KV Y5P RADIAL; Manufacturer: Vishay BC Components; Manufacturer Part Number: S102K29Y5PN63J5R; Tolerance: ±10%; Voltage - Rated: 1000V (1kV); Temperature Coefficient: Y5P (B); Type: Ceramic Singlelayer DC Disc Capacitors for General Purpose Class 1, Class 2, and Class 3, 1 kVDC, 2 kVDC, 3 kVDC, 6 kVDC; Voltage Rating DC: 1 kVDC; Brand: Vishay / BC Components; Capacitance - nF: 1 nF; Capacitance - uF: 0.001 uF; Class: Class 2; Lead Diameter: 0.6 mm; Temperature Coefficient / Code: 10 %; Supplier 1: Digi-Key; Supplier Part Number 1: 1251PH-ND; RoHS: RoHS Compliant; Category: Capacitors; Stock 1: 21156; Pricing 1: 1=0.25, 10=0.168, 50=0.1008, 100=0.0851, 250=0.06944, 500=0.05824, 1000=0.05152, 5000=0.0448, 10000=0.04256 (USD); Packaging: Bulk; Part Status: Active; Capacitance: 1000pF; Operating Temperature: -30°C ~ 85°C; Features: -; Ratings: -; Applications: General Purpose; Failure Rate: -; Mounting Type: Through Hole; Package / Case: Radial, Disc; Size / Dimension: 0.295" Dia (7.50mm); Height - Seated (Max): 0.453" (11.50mm); Thickness (Max): -; Lead Spacing: 0.197" (5.00mm); Lead Style: Formed Leads - Kinked; ComponentLink1URL: http://www.vishay.com/docs/28515/sseries.pdf; ComponentLink1Description: http://www.vishay.com/docs/28515/sseries.pdf; Supplier 2: Mouser; Supplier Part Number 2: 594-S102K29Y5PN63J5R; Stock 2: 14790; Pricing 2: 1=0.250, 10=0.101, 100=0.059, 1000=0.052, 2000=0.050, 5000=0.045 (USD); Application: Safety; Diameter: 7.5 mm; Height: -; Length: -; Operating Temperature Range: - 30 C to + 85 C; Product: Ceramic Disc Capacitors; Series: S Series; Termination Style: Radial; Thickness: 4 mm; Voltage Rating: 1 kV; Dielectric: Y5P; Maximum Operating Temperature: + 85 C; Minimum Operating Temperature: - 30 C; Standard Pack Qty: 1000; RoHS - Mouser: Y; Minimum Order Quantity: 1; Reeling: False; ComponentLink2URL: http://www.mouser.com/ds/2/427/sseries-239781.pdf; ComponentLink2Description: http://www.mouser.com/ds/2/427/sseries-239781.pdf
footprint DISC/D7.0/F7.5
pins: 1, 2


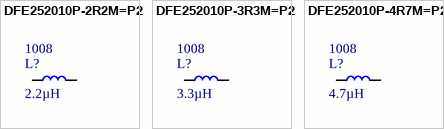
[diagram p14: symbols DFE252010P-2R2M=P2 to DFE252010P-4R7M=P2]

## DFE252010P-2R2M=P2
designator L?, comment 2.2µH  Package: 1008
FIXED IND 2.2UH 2.6A 115 MOHM; Manufacturer: Murata Electronics North America; Manufacturer Part Number: DFE252010P-2R2M=P2; Type: Wirewound; Material - Core: Powdered Iron; Tolerance: ±20%; Shielding: Shielded; DC Resistance (DCR): 115 mOhm Max; Frequency - Test: 1MHz; Supplier 1: Digi-Key; Supplier Part Number 1: 490-10637-1-ND; RoHS: RoHS Compliant; Category: Inductors, Coils, Chokes; Stock 1: 1783; Pricing 1: 1=0.51, 10=0.443, 25=0.4116, 50=0.3484, 100=0.3167, 250=0.29768, 500=0.266, 1000=0.21534 (USD); Packaging: Cut Tape (CT); Part Status: Active; Inductance: 2.2µH; Current Rating: 2.6A; Current - Saturation: -; Q @ Freq: -; Frequency - Self Resonant: -; Ratings: -; Operating Temperature: -40°C ~ 125°C; Mounting Type: Surface Mount; Supplier Device Package: 1008 (2520 Metric); Size / Dimension: 0.098" L x 0.079" W (2.50mm x 2.00mm); Height - Seated (Max): 0.039" (1.00mm); ComponentLink1URL: http://www.murata.com/~/media/webrenewal/products/inductor/chip/tokoproducts/wirewoundmetalalloychiptype/m_dfe252010p.ashx; ComponentLink1Description: http://www.murata.com/~/media/webrenewal/products/inductor/chip/tokoproducts/wirewoundmetalalloychiptype/m_dfe252010p.ashx
footprint L 1008 (2520) (Chip Capacitor, 2-Leads, Body 2.0x1.3mm, IPC Medium Density)
pins: 1, 2

## DFE252010P-3R3M=P2
designator L?, comment 3.3µH  Package: 1008
FIXED IND 3.3UH 2.1A 195 MOHM; Manufacturer: Murata Electronics North America; Manufacturer Part Number: DFE252010P-3R3M=P2; Type: Wirewound; Material - Core: Powdered Iron; Tolerance: ±20%; Shielding: Shielded; DC Resistance (DCR): 195 mOhm Max; Frequency - Test: 1MHz; Supplier 1: Digi-Key; Supplier Part Number 1: 490-10638-1-ND; RoHS: RoHS Compliant; Category: Inductors, Coils, Chokes; Stock 1: 2820; Pricing 1: 1=0.51, 10=0.443, 25=0.4116, 50=0.3484, 100=0.3167, 250=0.29768, 500=0.266, 1000=0.21534 (USD); Packaging: Cut Tape (CT); Part Status: Active; Inductance: 3.3µH; Current Rating: 2.1A; Current - Saturation: -; Q @ Freq: -; Frequency - Self Resonant: -; Ratings: -; Operating Temperature: -40°C ~ 125°C; Mounting Type: Surface Mount; Supplier Device Package: 1008 (2520 Metric); Size / Dimension: 0.098" L x 0.079" W (2.50mm x 2.00mm); Height - Seated (Max): 0.039" (1.00mm); ComponentLink1URL: http://www.murata.com/~/media/webrenewal/products/inductor/chip/tokoproducts/wirewoundmetalalloychiptype/m_dfe252010p.ashx; ComponentLink1Description: http://www.murata.com/~/media/webrenewal/products/inductor/chip/tokoproducts/wirewoundmetalalloychiptype/m_dfe252010p.ashx
footprint L 1008 (2520) (Chip Capacitor, 2-Leads, Body 2.0x1.3mm, IPC Medium Density)
pins: 1, 2

## DFE252010P-4R7M=P2
designator L?, comment 4.7µH  Package: 1008
FIXED IND 4.7UH 1.7A 270 MOHM; Manufacturer: Murata Electronics North America; Manufacturer Part Number: DFE252010P-4R7M=P2; Type: Wirewound; Material - Core: Powdered Iron; Tolerance: ±20%; Shielding: Shielded; DC Resistance (DCR): 270 mOhm Max; Frequency - Test: 1MHz; Supplier 1: Digi-Key; Supplier Part Number 1: 490-10639-1-ND; RoHS: RoHS Compliant; Category: Inductors, Coils, Chokes; Stock 1: 1730; Pricing 1: 1=0.51, 10=0.443, 25=0.4116, 50=0.3484, 100=0.3167, 250=0.29768, 500=0.266, 1000=0.21534 (USD); Packaging: Cut Tape (CT); Part Status: Active; Inductance: 4.7µH; Current Rating: 1.7A; Current - Saturation: -; Q @ Freq: -; Frequency - Self Resonant: -; Ratings: -; Operating Temperature: -40°C ~ 125°C; Mounting Type: Surface Mount; Supplier Device Package: 1008 (2520 Metric); Size / Dimension: 0.098" L x 0.079" W (2.50mm x 2.00mm); Height - Seated (Max): 0.039" (1.00mm); ComponentLink1URL: http://www.murata.com/~/media/webrenewal/products/inductor/chip/tokoproducts/wirewoundmetalalloychiptype/m_dfe252010p.ashx; ComponentLink1Description: http://www.murata.com/~/media/webrenewal/products/inductor/chip/tokoproducts/wirewoundmetalalloychiptype/m_dfe252010p.ashx
footprint L 1008 (2520) (Chip Capacitor, 2-Leads, Body 2.0x1.3mm, IPC Medium Density)
pins: 1, 2


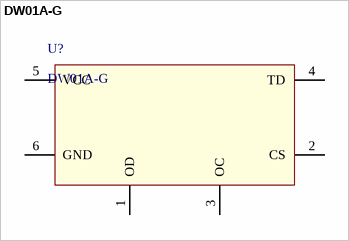
[diagram p15: symbol DW01A-G]

## DW01A-G
designator U?
One Cell Lithium-ion/Polymer Battery Protection IC; Manufacturer: Fortune; Manufacturer Part Number: DW01A-G; Category: Integrated Circuits (ICs); Mounting Type: Surface Mount; Supplier Device Package: SOT23-6; ComponentLink1URL: http://www.ic-fortune.com/upload/Download/DW01x-DS-17_EN.pdf; ComponentLink1Description: http://www.ic-fortune.com/upload/Download/DW01x-DS-17_EN.pdf; Package: SOT23-6
footprint SOT-23-6 (SOT23, 6-Leads, Body 3.0x3.0mm (max), Pitch 0.95mm, IPC Medium Density)
pins: 1 OD "MOSFET gate connection pin for discharge control", 2 CS "Input pin for current sense, charger detect", 3 OC "MOSFET gate connection pin for charge control", 4 TD "Test pin for reduce delay time", 5 VCC "Power supply, through a resistor (R1)", 6 GND "Ground pin"


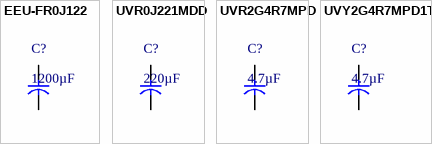
[diagram p16: symbols EEU-FR0J122 to UVY2G4R7MPD1TD]

## EEU-FR0J122
designator C?, comment 1200µF
CAP ALUM 1200UF 20% 6.3V RADIAL; Manufacturer: Panasonic Electronic Components; Manufacturer Part Number: EEU-FR0J122; Lifetime @ Temp.: 6000 Hrs @ 105°C; Polarization: Polar; Ripple Current: 1.032A @ 120Hz; Impedance: 43 mOhm; Type: Radial Lead Type; Voltage Rating DC: 6.3 VDC; Brand: Panasonic; ESR: 43 mOhms; Life: 6000 Hour; Supplier 1: Digi-Key; Supplier Part Number 1: P14362-ND; RoHS: RoHS Compliant; Category: Capacitors; Stock 1: 1693; Pricing 1: 1=0.64, 10=0.469, 25=0.4016, 50=0.375, 100=0.3214, 250=0.2946, 500=0.25442, 1000=0.21424, 2500=0.20085 (USD); Packaging: Bulk; Part Status: Active; Capacitance: 1200µF; Tolerance: ±20%; Voltage Rating: 6.3V; ESR (Equivalent Series Resistance): -; Operating Temperature: -40°C ~ 105°C; Applications: General Purpose; Lead Spacing: 0.197" (5.00mm); Size / Dimension: 0.394" Dia (10.00mm); Height - Seated (Max): 0.551" (14.00mm); Surface Mount Land Size: -; Mounting Type: Through Hole; Package / Case: Radial, Can; ComponentLink1URL: http://industrial.panasonic.com/cdbs/www-data/pdf/RDF0000/ABA0000C836.pdf; ComponentLink1Description: http://industrial.panasonic.com/cdbs/www-data/pdf/RDF0000/ABA0000C836.pdf; Supplier 2: Mouser; Supplier Part Number 2: 667-EEU-FR0J122; Stock 2: 732; Pricing 2: 1=0.640, 10=0.375, 100=0.294, 500=0.254, 1000=0.214, 2500=0.200, 10000=0.181, 25000=0.174, 50000=0.167 (USD); Diameter: 10 mm; Length: 12.5 mm; Product: Low ESR Electrolytic Capacitors; Series: FR; Termination Style: Radial; Maximum Operating Temperature: + 105 C; Standard Pack Qty: 200; RoHS - Mouser: Y; Minimum Order Quantity: 1; Reeling: False; ComponentLink2URL: http://www.mouser.com/ds/2/315/ABA0000C1021-947569.pdf; ComponentLink2Description: http://www.mouser.com/ds/2/315/ABA0000C1021-947569.pdf
footprint CYLN/D100/H125/LS50 (Dia 10mm, Heigh 12.5mm, Lead Space 5.0mm)
pins: 1, 2

## UVR0J221MDD
designator C?, comment 220µF
CAP ALUM 220UF 20% 6.3V RADIAL; Manufacturer: Nichicon; Manufacturer Part Number: UVR0J221MDD; Lifetime @ Temp.: 2000 Hrs @ 85°C; Ripple Current: 200mA; Voltage Rating DC: 6.3 VDC; Leakage Current: 41.58 uA; Dissipation Factor DF: 0.28; Life: 2000 Hour; Supplier 1: Digi-Key; Supplier Part Number 1: 493-1004-ND; RoHS: RoHS Compliant; Category: Capacitors; Stock 1: 4402; Pricing 1: 1=0.25, 10=0.171, 25=0.1256, 50=0.1026, 100=0.0866, 250=0.07068, 500=0.05928, 1000=0.05244, 5000=0.0456 (USD); Packaging: Bulk; Part Status: Active; Capacitance: 220µF; Tolerance: ±20%; Voltage Rating: 6.3V; ESR (Equivalent Series Resistance): -; Operating Temperature: -40°C ~ 85°C; Polarization: -; Applications: General Purpose; Impedance: -; Lead Spacing: 0.079" (2.00mm); Size / Dimension: 0.197" Dia (5.00mm); Height - Seated (Max): 0.492" (12.50mm); Surface Mount Land Size: -; Mounting Type: Through Hole; Package / Case: Radial, Can; ComponentLink1URL: http://nichicon-us.com/english/products/pdfs/e-uvr.pdf; ComponentLink1Description: http://nichicon-us.com/english/products/pdfs/e-uvr.pdf; Supplier 2: Mouser; Supplier Part Number 2: 647-UVR0J221MDD; Stock 2: 4400; Pricing 2: 1=0.250, 10=0.103, 100=0.071, 500=0.060, 1000=0.051, 5000=0.039 (USD); Diameter: 5 mm; Length: 11 mm; Product: General Purpose Electrolytic Capacitors; Series: VR; Termination Style: Radial; Brand: Nichicon; Maximum Operating Temperature: + 85 C; Standard Pack Qty: 200; RoHS - Mouser: Y; Minimum Order Quantity: 1; Reeling: False; ComponentLink2URL: http://www.mouser.com/ds/2/293/e-vr-6088.pdf; ComponentLink2Description: http://www.mouser.com/ds/2/293/e-vr-6088.pdf
footprint CYLN/D050/H110/LS20 (Dia 5mm, Heigh 11mm, Lead Space 2mm)
footprint CYLN/D050/H110/LS20/RA (Dia 5mm, Heigh 11mm, Lead Space 2mm, Right Angle)
pins: 1, 2

## UVR2G4R7MPD
designator C?, comment 4.7µF
CAP ALUM 4.7UF 20% 400V RADIAL; Manufacturer: Nichicon; Manufacturer Part Number: UVR2G4R7MPD; Lifetime @ Temp.: 2000 Hrs @ 85°C; Ripple Current: 70mA; Voltage Rating DC: 400 VDC; Leakage Current: 175.2 uA; Dissipation Factor DF: 0.25; Life: 2000 Hour; Supplier 1: Digi-Key; RoHS: RoHS Compliant; Category: Capacitors; Stock 1: 20711; Pricing 1: 1=0.45, 10=0.315, 25=0.2692, 50=0.2384, 100=0.2076, 250=0.17688, 500=0.1538, 1000=0.13073, 5000=0.11535 (USD); Packaging: Bulk; Part Status: Active; Capacitance: 4.7µF; Tolerance: ±20%; Voltage Rating: 400V; ESR (Equivalent Series Resistance): -; Operating Temperature: -40°C ~ 85°C; Polarization: -; Applications: General Purpose; Impedance: -; Lead Spacing: 0.197" (5.00mm); Size / Dimension: 0.394" Dia (10.00mm); Height - Seated (Max): 0.689" (17.50mm); Surface Mount Land Size: -; Mounting Type: Through Hole; Package / Case: Radial, Can; ComponentLink1URL: http://nichicon-us.com/english/products/pdfs/e-uvr.pdf; ComponentLink1Description: http://nichicon-us.com/english/products/pdfs/e-uvr.pdf; Supplier 2: Mouser; Stock 2: 7396; Pricing 2: 1=0.450, 10=0.238, 100=0.176, 500=0.153, 1000=0.152, 5000=0.104 (USD); Diameter: 10 mm; Length: 16 mm; Product: General Purpose Electrolytic Capacitors; Series: VR; Termination Style: Radial; Brand: Nichicon; Maximum Operating Temperature: + 85 C; Standard Pack Qty: 200; RoHS - Mouser: Y; Minimum Order Quantity: 1; Reeling: False; ComponentLink2URL: http://www.mouser.com/ds/2/293/e-vr-6088.pdf; ComponentLink2Description: http://www.mouser.com/ds/2/293/e-vr-6088.pdf; Supplier Part Number 1: 493-1229-ND; Supplier Part Number 2: 647-UVR2G4R7MPD
footprint CYLN/D100/H125/LS50 (Dia 10mm, Heigh 12.5mm, Lead Space 5.0mm)
pins: 1, 2

## UVY2G4R7MPD1TD
designator C?, comment 4.7µF
CAP ALUM 4.7UF 20% 400V RADIAL; Manufacturer: Nichicon; Manufacturer Part Number: UVY2G4R7MPD1TD; Lifetime @ Temp.: 1000 Hrs @ 105°C; Ripple Current: 42mA; Voltage Rating DC: 400 VDC; Supplier 1: Digi-Key; Supplier Part Number 1: 493-12991-1-ND; RoHS: RoHS Compliant; Category: Capacitors; Stock 1: 1361; Pricing 1: 1=0.51, 10=0.362, 25=0.3092, 50=0.274, 100=0.2386, 250=0.20324 (USD); Packaging: Cut Tape (CT); Part Status: Active; Capacitance: 4.7µF; Tolerance: ±20%; Voltage Rating: 400V; ESR (Equivalent Series Resistance): -; Operating Temperature: -40°C ~ 105°C; Polarization: -; Applications: General Purpose; Impedance: -; Lead Spacing: 0.197" (5.00mm); Size / Dimension: 0.394" Dia (10.00mm); Height - Seated (Max): 0.551" (14.00mm); Surface Mount Land Size: -; Mounting Type: Through Hole; Package / Case: Radial, Can; ComponentLink1URL: http://nichicon-us.com/english/products/pdfs/e-uvy.pdf; ComponentLink1Description: http://nichicon-us.com/english/products/pdfs/e-uvy.pdf; Supplier 2: Mouser; Supplier Part Number 2: 647-UVY2G4R7MPD1TD; Stock 2: 1500; Pricing 2: 1=0.550, 10=0.316, 100=0.214, 500=0.158, 1000=0.135, 2500=0.127, 5000=0.119, 10000=0.109, 25000=0.103 (USD); Product: General Purpose Electrolytic Capacitors; Series: UVY; Termination Style: Radial; Brand: Nichicon; Standard Pack Qty: 500; RoHS - Mouser: Y; Minimum Order Quantity: 1; Reeling: True; ComponentLink2URL: http://www.mouser.com/ds/2/293/e-uvy-880047.pdf; ComponentLink2Description: http://www.mouser.com/ds/2/293/e-uvy-880047.pdf
footprint CYLN/D100/H125/LS50 (Dia 10mm, Heigh 12.5mm, Lead Space 5.0mm)
pins: 1, 2


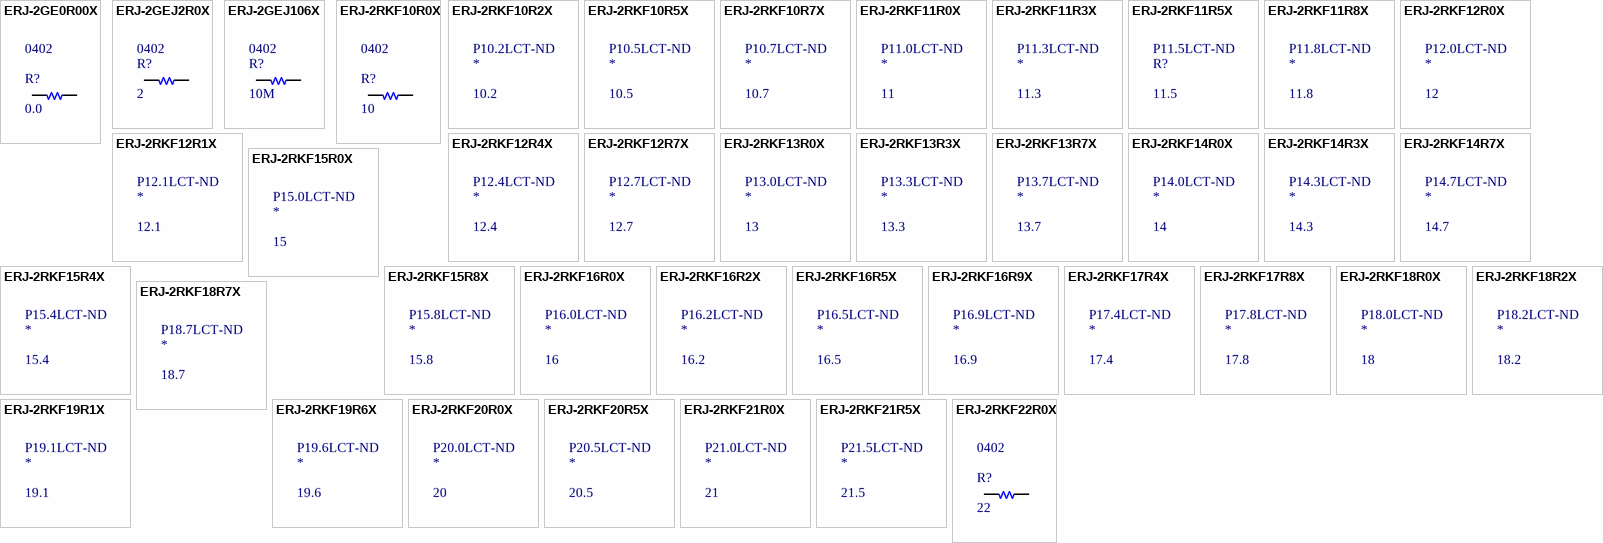
[diagram p17: symbols ERJ-2GE0R00X to ERJ-2RKF22R0X]

## ERJ-2GE0R00X
designator R?, comment 0.0  Supplier Device Package: 0402
RES SMD 0.0OHM JUMPER 1/10W 0402; Manufacturer: Panasonic Electronic Components; Manufacturer Part Number: ERJ-2GE0R00X; Power (Watts): 0.1W, 1/10W; Supplier 1: Digi-Key; RoHS: RoHS Compliant; Category: Resistors; Stock 1: 4258679; Pricing 1: 1=0.1, 10=0.016, 25=0.0116, 50=0.0088, 100=0.0065, 250=0.00496, 500=0.00396, 1000=0.00292, 5000=0.00209 (USD); Packaging: Cut Tape (CT); Part Status: Active; Resistance: 0.0; Tolerance: Jumper; Composition: Thick Film; Features: Automotive AEC-Q200; Temperature Coefficient: -; Operating Temperature: -55°C ~ 155°C; Package: 0402; Size / Dimension: 0.039" L x 0.020" W (1.00mm x 0.50mm); Height - Seated (Max): 0.016" (0.40mm); Failure Rate: -; ComponentLink1URL: http://industrial.panasonic.com/www-cgi/jvcr13pz.cgi?E+PZ+3+AOA0001+ERJ2GE0R00X+7+WW; ComponentLink1Description: http://industrial.panasonic.com/www-cgi/jvcr13pz.cgi?E+PZ+3+AOA0001+ERJ2GE0R00X+7+WW; Supplier Part Number 1: P0.0JCT-ND
footprint R 0402 (Chip Resistor, 2-Leads, Body 1.0x0.5mm, IPC Medium Density)
pins: 1, 2

## ERJ-2GEJ2R0X
designator R?, comment 2  Package: 0402